# Altium footprint library Molex FFC - FPC Connectors (SMT).PcbLib: 638 footprints (part 30 of 40)
Each footprint in its own frame and in the unit in brackets; x right, y up, seen from the top. Pads: shape width x height; smd on the part's side, far side on the other; paste and mask are expansions set on the pad; w line width, h text height; cw(c..) or ccw(c..) is an arc to the next point about the centre after c.
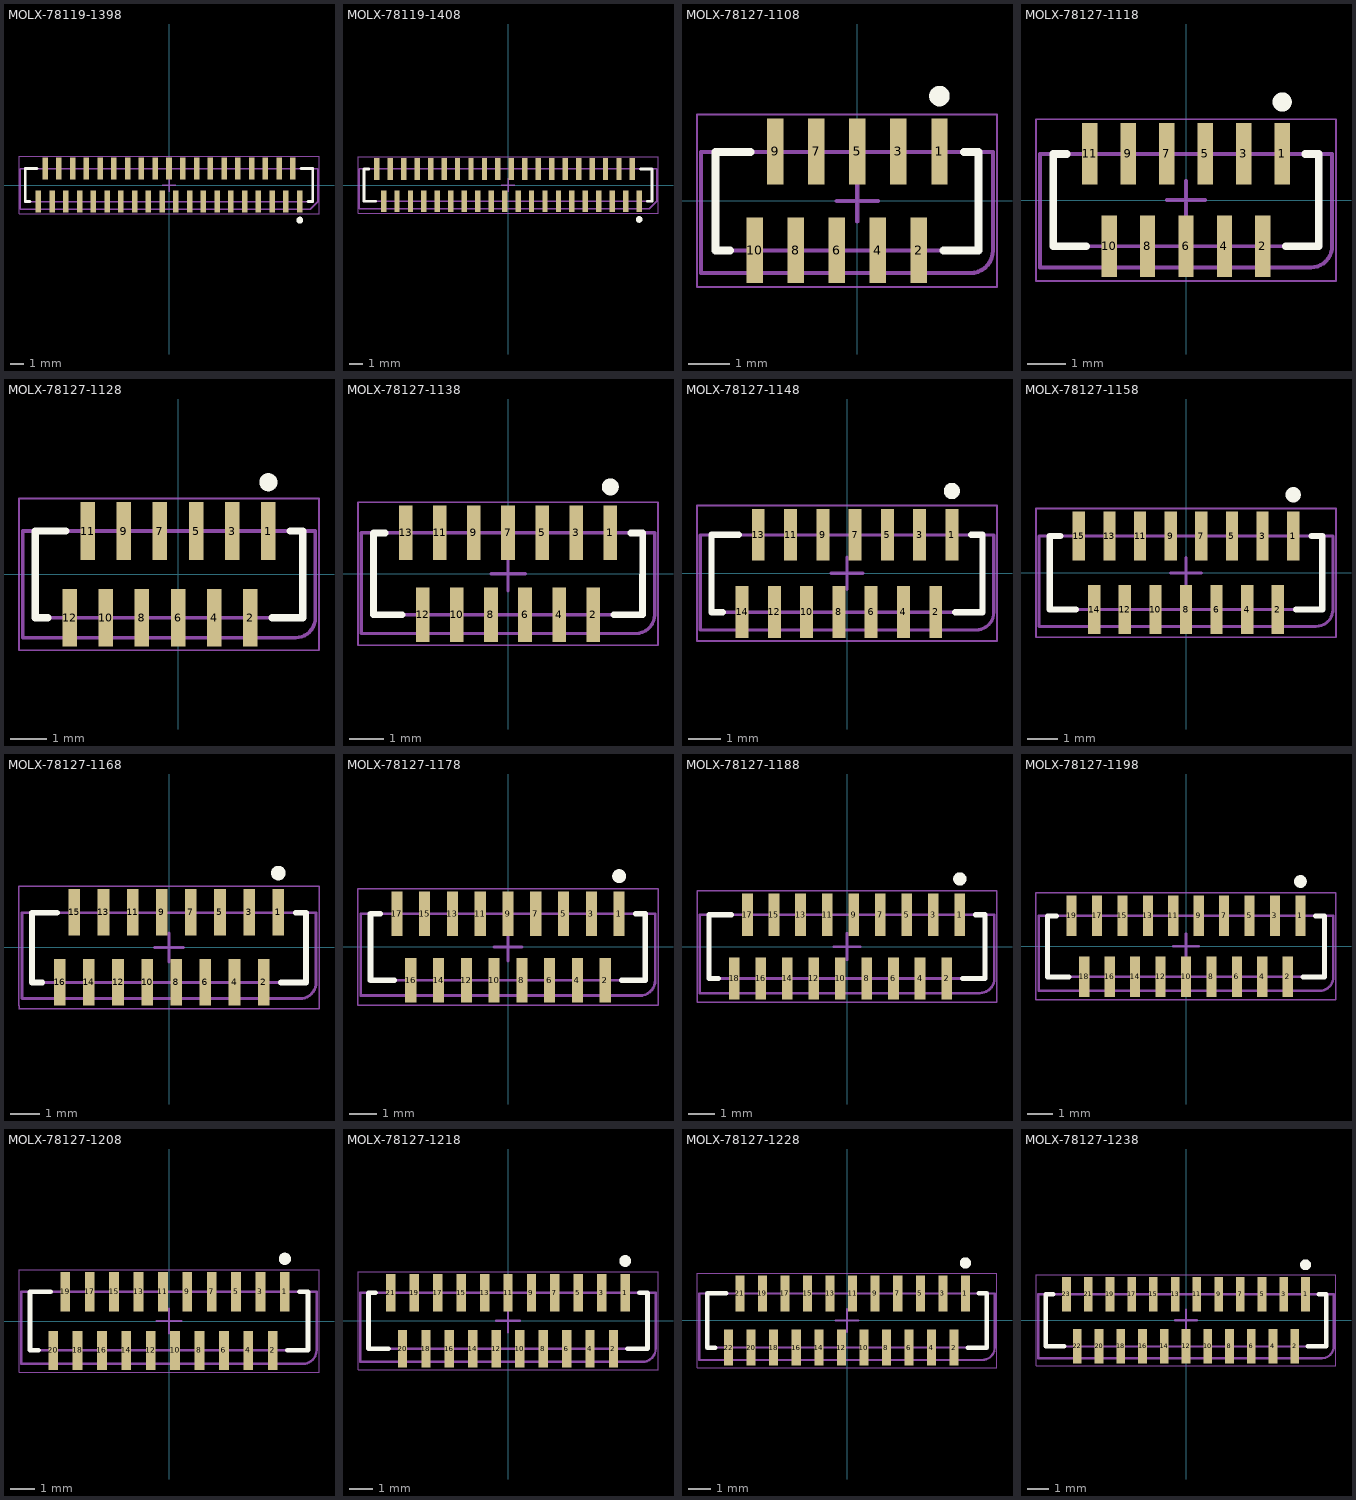
[diagram p29: the footprints below, top view; thin cyan lines are the x and y axes]

## MOLX-78119-1398 [mm] "FPC Connector, 39-Leads, Vertical, Pitch 0.5 mm, Mated Height 4.1 mm, SMT"
height 4.1
pads (39):
  rect 0.4x1.6 smd: 1(9.5,-1.2) 2(9,1.2) 3(8.5,-1.2) 4(8,1.2) 5(7.5,-1.2) 6(7,1.2) 7(6.5,-1.2) 8(6,1.2) 9(5.5,-1.2) 10(5,1.2) 11(4.5,-1.2) 12(4,1.2) 13(3.5,-1.2) 14(3,1.2) 15(2.5,-1.2) 16(2,1.2) 17(1.5,-1.2) 18(1,1.2) 19(0.5,-1.2) 20(0,1.2) 21(-0.5,-1.2) 22(-1,1.2) 23(-1.5,-1.2) 24(-2,1.2) 25(-2.5,-1.2) 26(-3,1.2) 27(-3.5,-1.2) 28(-4,1.2) 29(-4.5,-1.2) 30(-5,1.2) 31(-5.5,-1.2) 32(-6,1.2) 33(-6.5,-1.2) 34(-7,1.2) 35(-7.5,-1.2) 36(-8,1.2) 37(-8.5,-1.2) 38(-9,1.2) 39(-9.5,-1.2)
Top Overlay:
  circle w0.25: c9.5,-2.55 r0.125
  lines w0.2: -10.1,-1.2 -10.45,-1.2 -10.45,1.2 -9.6,1.2 ; 9.6,1.2 10.45,1.2 10.45,-1.2 10.1,-1.2
Mechanical 13:
  lines w0.1: -10.45,1.2 -10.45,-1.2 10.45,-1.2 10.45,1.2 ; -10.45,1.2 10.45,1.2 ; -10.45,1.2 -10.8,1.2 -10.8,-1.75 10.25,-1.75 10.8,-1.2 10.8,1.2 10.45,1.2
Mechanical 15:
  lines w0.05: -10.9,-2.1 10.9,-2.1 10.9,2.1 -10.9,2.1 -10.9,-2.1
  lines w0.1: -0.5,0 0.5,0 ; 0,-0.5 0,0.5
3D body: height 0.25, standoff 0, extent -10.8,-1.75 10.8,1.7

## MOLX-78119-1408 [mm] "FPC Connector, 40-Leads, Vertical, Pitch 0.5 mm, Mated Height 4.1 mm, SMT"
height 4.1
pads (40):
  rect 0.4x1.6 smd: 1(9.75,-1.2) 2(9.25,1.2) 3(8.75,-1.2) 4(8.25,1.2) 5(7.75,-1.2) 6(7.25,1.2) 7(6.75,-1.2) 8(6.25,1.2) 9(5.75,-1.2) 10(5.25,1.2) 11(4.75,-1.2) 12(4.25,1.2) 13(3.75,-1.2) 14(3.25,1.2) 15(2.75,-1.2) 16(2.25,1.2) 17(1.75,-1.2) 18(1.25,1.2) 19(0.75,-1.2) 20(0.25,1.2) 21(-0.25,-1.2) 22(-0.75,1.2) 23(-1.25,-1.2) 24(-1.75,1.2) 25(-2.25,-1.2) 26(-2.75,1.2) 27(-3.25,-1.2) 28(-3.75,1.2) 29(-4.25,-1.2) 30(-4.75,1.2) 31(-5.25,-1.2) 32(-5.75,1.2) 33(-6.25,-1.2) 34(-6.75,1.2) 35(-7.25,-1.2) 36(-7.75,1.2) 37(-8.25,-1.2) 38(-8.75,1.2) 39(-9.25,-1.2) 40(-9.75,1.2)
Top Overlay:
  circle w0.25: c9.75,-2.55 r0.125
  lines w0.2: -10.35,1.2 -10.7,1.2 -10.7,-1.2 -9.85,-1.2 ; 9.85,1.2 10.7,1.2 10.7,-1.2 10.35,-1.2
Mechanical 13:
  lines w0.1: -10.7,1.2 -10.7,-1.2 10.7,-1.2 10.7,1.2 ; -11.05,-1.75 10.5,-1.75 11.05,-1.2 11.05,1.2 -11.05,1.2 -11.05,-1.2 -11.05,-1.75
Mechanical 15:
  lines w0.05: -11.15,-2.1 -11.15,2.1 11.15,2.1 11.15,-2.1 -11.15,-2.1
  lines w0.1: -0.5,0 0.5,0 ; 0,-0.5 0,0.5
3D body: height 0.25, standoff 0, extent -11.05,-1.75 11.05,1.7

## MOLX-78127-1108 [mm] "FPC Connector, 10-Leads, Vertical, Pitch 0.5 mm, Mated Height 4.1 mm, SMT"
height 4.112
pads (10):
  rect 0.4x1.6 smd: 1(2,1.2) 2(1.5,-1.2) 3(1,1.2) 4(0.5,-1.2) 5(0,1.2) 6(-0.5,-1.2) 7(-1,1.2) 8(-1.5,-1.2) 9(-2,1.2) 10(-2.5,-1.2)
Top Overlay:
  circle w0.25: c2,2.55 r0.125
  lines w0.2: -3.1,-1.21 -3.45,-1.21 -3.45,1.19 -2.6,1.19 ; 2.1,-1.21 2.95,-1.21 2.95,1.19 2.6,1.19
Mechanical 13:
  lines w0.1: -3.45,1.19 -3.45,-1.21 2.95,-1.21 2.95,1.19 ; 2.75,-1.759 cw(c2.75,-1.759) 2.75,-1.76 ; 2.75,-1.76 ccw(c2.75,-1.21) 3.3,-1.21 3.3,1.19 -3.8,1.19 -3.8,-1.76 2.75,-1.76
Mechanical 15:
  lines w0.05: -3.9,-2.1 -3.9,2.1 3.4,2.1 3.4,-2.1 -3.9,-2.1
  lines w0.1: -0.5,0 0.5,0 ; 0,-0.5 0,0.5
3D body: height 0.25, standoff 0, extent -3.8,-1.76 3.3,1.69

## MOLX-78127-1118 [mm] "FPC Connector, 11-Leads, Vertical, Pitch 0.5 mm, Mated Height 4.1 mm, SMT"
height 4.112
pads (11):
  rect 0.4x1.6 smd: 1(2.5,1.2) 2(2,-1.2) 3(1.5,1.2) 4(1,-1.2) 5(0.5,1.2) 6(0,-1.2) 7(-0.5,1.2) 8(-1,-1.2) 9(-1.5,1.2) 10(-2,-1.2) 11(-2.5,1.2)
Top Overlay:
  circle w0.25: c2.5,2.55 r0.125
  lines w0.2: -3.1,1.2 -3.45,1.2 -3.45,-1.2 -2.6,-1.2 ; 2.6,-1.2 3.45,-1.2 3.45,1.2 3.1,1.2
Mechanical 13:
  lines w0.1: -3.45,1.2 -3.45,-1.2 3.45,-1.2 3.45,1.2 ; -3.8,-1.75 -3.8,1.2 3.8,1.2 3.8,-1.2 cw(c3.25,-1.2) 3.25,-1.75 -3.8,-1.75
Mechanical 15:
  lines w0.05: -3.9,-2.1 3.9,-2.1 3.9,2.1 -3.9,2.1 -3.9,-2.1
  lines w0.1: -0.5,0 0.5,0 ; 0,-0.5 0,0.5
3D body: height 0.25, standoff 0, extent -3.8,-1.75 3.8,1.7

## MOLX-78127-1128 [mm] "FPC Connector, 12-Leads, Vertical, Pitch 0.5 mm, Mated Height 4.1 mm, SMT"
height 4.112
pads (12):
  rect 0.4x1.6 smd: 1(2.5,1.2) 2(2,-1.2) 3(1.5,1.2) 4(1,-1.2) 5(0.5,1.2) 6(0,-1.2) 7(-0.5,1.2) 8(-1,-1.2) 9(-1.5,1.2) 10(-2,-1.2) 11(-2.5,1.2) 12(-3,-1.2)
Top Overlay:
  circle w0.25: c2.5,2.55 r0.125
  lines w0.2: -3.6,-1.2 -3.95,-1.2 -3.95,1.2 -3.1,1.2 ; 2.6,-1.2 3.45,-1.2 3.45,1.2 3.1,1.2
Mechanical 13:
  lines w0.1: -3.95,1.2 -3.95,-1.2 3.45,-1.2 3.45,1.2 ; -4.3,-1.75 3.25,-1.75 ccw(c3.25,-1.2) 3.8,-1.2 3.8,1.2 -4.3,1.2 -4.3,-1.75
Mechanical 15:
  lines w0.05: -4.4,-2.1 -4.4,2.1 3.9,2.1 3.9,-2.1 -4.4,-2.1
3D body: height 0.25, standoff 0, extent -4.3,-1.75 3.8,1.7

## MOLX-78127-1138 [mm] "FPC Connector, 13-Leads, Vertical, Pitch 0.5 mm, Mated Height 4.1 mm, SMT"
height 4.112
pads (13):
  rect 0.4x1.6 smd: 1(3,1.2) 2(2.5,-1.2) 3(2,1.2) 4(1.5,-1.2) 5(1,1.2) 6(0.5,-1.2) 7(0,1.2) 8(-0.5,-1.2) 9(-1,1.2) 10(-1.5,-1.2) 11(-2,1.2) 12(-2.5,-1.2) 13(-3,1.2)
Top Overlay:
  circle w0.25: c3,2.55 r0.125
  lines w0.2: -3.6,1.2 -3.95,1.2 -3.95,-1.2 -3.1,-1.2 ; 3.1,-1.2 3.95,-1.2 3.95,1.2 3.6,1.2
Mechanical 13:
  lines w0.1: -3.95,1.2 -3.95,-1.2 3.95,-1.2 3.95,1.2 ; -4.3,-1.75 3.75,-1.75 ccw(c3.75,-1.2) 4.3,-1.2 4.3,1.2 -4.3,1.2 -4.3,-1.75
Mechanical 15:
  lines w0.05: -4.4,-2.1 -4.4,2.1 4.4,2.1 4.4,-2.1 -4.4,-2.1
  lines w0.1: -0.5,0 0.5,0 ; 0,-0.5 0,0.5
3D body: height 0.25, standoff 0, extent -4.3,-1.75 4.3,1.7

## MOLX-78127-1148 [mm] "FPC Connector, 14-Leads, Vertical, Pitch 0.5 mm, Mated Height 4.1 mm, SMT"
height 4.112
pads (14):
  rect 0.4x1.6 smd: 1(3.25,1.2) 2(2.75,-1.2) 3(2.25,1.2) 4(1.75,-1.2) 5(1.25,1.2) 6(0.75,-1.2) 7(0.25,1.2) 8(-0.25,-1.2) 9(-0.75,1.2) 10(-1.25,-1.2) 11(-1.75,1.2) 12(-2.25,-1.2) 13(-2.75,1.2) 14(-3.25,-1.2)
Top Overlay:
  circle w0.25: c3.25,2.55 r0.125
  lines w0.2: -3.85,-1.21 -4.2,-1.21 -4.2,1.19 -3.35,1.19 ; 3.35,-1.21 4.2,-1.21 4.2,1.19 3.85,1.19
Mechanical 13:
  lines w0.1: -4.2,1.19 -4.2,-1.21 4.2,-1.21 4.2,1.19 ; -4.55,-1.76 4,-1.76 ccw(c4,-1.21) 4.55,-1.21 4.55,1.19 -4.55,1.19 -4.55,-1.76
Mechanical 15:
  lines w0.05: -4.65,-2.1 4.65,-2.1 4.65,2.1 -4.65,2.1 -4.65,-2.1
  lines w0.1: -0.5,0 0.5,0 ; 0,-0.5 0,0.5
3D body: height 0.25, standoff 0, extent -4.55,-1.76 4.55,1.69

## MOLX-78127-1158 [mm] "FPC Connector, 15-Leads, Vertical, Pitch 0.5 mm, Mated Height 4.1 mm, SMT"
height 4.112
pads (15):
  rect 0.4x1.6 smd: 1(3.5,1.2) 2(3,-1.2) 3(2.5,1.2) 4(2,-1.2) 5(1.5,1.2) 6(1,-1.2) 7(0.5,1.2) 8(0,-1.2) 9(-0.5,1.2) 10(-1,-1.2) 11(-1.5,1.2) 12(-2,-1.2) 13(-2.5,1.2) 14(-3,-1.2) 15(-3.5,1.2)
Top Overlay:
  circle w0.25: c3.5,2.55 r0.125
  lines w0.2: -4.1,1.2 -4.45,1.2 -4.45,-1.2 -3.6,-1.2 ; 3.6,-1.2 4.45,-1.2 4.45,1.2 4.1,1.2
Mechanical 13:
  lines w0.1: -4.45,1.2 -4.45,-1.2 4.45,-1.2 4.45,1.2 ; -4.8,-1.75 -4.8,1.2 4.8,1.2 4.8,-1.2 cw(c4.25,-1.2) 4.25,-1.75 -4.8,-1.75
Mechanical 15:
  lines w0.05: -4.9,-2.1 4.9,-2.1 4.9,2.1 -4.9,2.1 -4.9,-2.1
  lines w0.1: -0.5,0 0.5,0 ; 0,-0.5 0,0.5
3D body: height 0.25, standoff 0, extent -4.8,-1.75 4.8,1.7

## MOLX-78127-1168 [mm] "FPC Connector, 16-Leads, Vertical, Pitch 0.5 mm, Mated Height 4.1 mm, SMT"
height 4.112
pads (16):
  rect 0.4x1.6 smd: 1(3.75,1.2) 2(3.25,-1.2) 3(2.75,1.2) 4(2.25,-1.2) 5(1.75,1.2) 6(1.25,-1.2) 7(0.75,1.2) 8(0.25,-1.2) 9(-0.25,1.2) 10(-0.75,-1.2) 11(-1.25,1.2) 12(-1.75,-1.2) 13(-2.25,1.2) 14(-2.75,-1.2) 15(-3.25,1.2) 16(-3.75,-1.2)
Top Overlay:
  circle w0.25: c3.75,2.55 r0.125
  lines w0.2: -4.35,-1.21 -4.7,-1.21 -4.7,1.19 -3.85,1.19 ; 3.85,-1.21 4.7,-1.21 4.7,1.19 4.35,1.19
Mechanical 13:
  lines w0.1: -4.7,1.19 -4.7,-1.21 4.7,-1.21 4.7,1.19 ; -5.05,-1.76 4.5,-1.76 ccw(c4.5,-1.21) 5.05,-1.21 5.05,1.19 -5.05,1.19 -5.05,-1.76 -5.05,-1.76
Mechanical 15:
  lines w0.05: -5.15,-2.1 5.15,-2.1 5.15,2.1 -5.15,2.1 -5.15,-2 -5.15,-2.1
  lines w0.1: -0.5,0 0.5,0 ; 0,-0.5 0,0.5
3D body: height 0.25, standoff 0, extent -5.05,-1.76 5.05,1.69

## MOLX-78127-1178 [mm] "FPC Connector, 17-Leads, Vertical, Pitch 0.5 mm, Mated Height 4.1 mm, SMT"
height 4.112
pads (17):
  rect 0.4x1.6 smd: 1(4,1.2) 2(3.5,-1.2) 3(3,1.2) 4(2.5,-1.2) 5(2,1.2) 6(1.5,-1.2) 7(1,1.2) 8(0.5,-1.2) 9(0,1.2) 10(-0.5,-1.2) 11(-1,1.2) 12(-1.5,-1.2) 13(-2,1.2) 14(-2.5,-1.2) 15(-3,1.2) 16(-3.5,-1.2) 17(-4,1.2)
Top Overlay:
  circle w0.25: c4,2.55 r0.125
  lines w0.2: -4.6,1.2 -4.95,1.2 -4.95,-1.2 -4.1,-1.2 ; 4.1,-1.197 4.947,-1.197 4.947,1.2 4.6,1.2
Mechanical 13:
  lines w0.1: -4.95,1.2 -4.95,-1.2 4.95,-1.2 4.95,1.196 ; -5.3,-1.75 4.749,-1.75 ccw(c4.75,-1.2) 5.3,-1.2 5.3,1.2 -5.3,1.2 -5.3,-1.75
Mechanical 15:
  lines w0.05: -5.4,-2.1 5.4,-2.1 5.4,2.1 -5.4,2.1 -5.4,-2.1
  lines w0.1: -0.5,0 0.5,0 ; 0,-0.5 0,0.5
3D body: height 0.25, standoff 0, extent -5.3,-1.75 5.3,1.7

## MOLX-78127-1188 [mm] "FPC Connector, 18-Leads, Vertical, Pitch 0.5 mm, Mated Height 4.1 mm, SMT"
height 4.112
pads (18):
  rect 0.4x1.6 smd: 1(4.25,1.2) 2(3.75,-1.2) 3(3.25,1.2) 4(2.75,-1.2) 5(2.25,1.2) 6(1.75,-1.2) 7(1.25,1.2) 8(0.75,-1.2) 9(0.25,1.2) 10(-0.25,-1.2) 11(-0.75,1.2) 12(-1.25,-1.2) 13(-1.75,1.2) 14(-2.25,-1.2) 15(-2.75,1.2) 16(-3.25,-1.2) 17(-3.75,1.2) 18(-4.25,-1.2)
Top Overlay:
  circle w0.25: c4.25,2.55 r0.125
  lines w0.2: -4.85,-1.2 -5.2,-1.2 -5.2,1.2 -4.35,1.2 ; 4.35,-1.2 5.2,-1.2 5.2,1.2 4.85,1.2
Mechanical 13:
  lines w0.1: -5.2,1.2 -5.2,-1.2 5.2,-1.2 5.2,1.2 ; -5.55,-1.75 5,-1.75 ccw(c5,-1.2) 5.55,-1.2 5.55,1.2 -5.55,1.2 -5.55,-1.75
Mechanical 15:
  lines w0.05: -5.65,-2.1 -5.65,2.1 5.65,2.1 5.65,-2.1 -5.65,-2.1
  lines w0.1: -0.5,0 0.5,0 ; 0,-0.5 0,0.5
3D body: height 0.25, standoff 0, extent -5.55,-1.75 5.55,1.7

## MOLX-78127-1198 [mm] "FPC Connector, 19-Leads, Vertical, Pitch 0.5 mm, Mated Height 4.1 mm, SMT"
height 4.112
pads (19):
  rect 0.4x1.6 smd: 1(4.5,1.2) 2(4,-1.2) 3(3.5,1.2) 4(3,-1.2) 5(2.5,1.2) 6(2,-1.2) 7(1.5,1.2) 8(1,-1.2) 9(0.5,1.2) 10(0,-1.2) 11(-0.5,1.2) 12(-1,-1.2) 13(-1.5,1.2) 14(-2,-1.2) 15(-2.5,1.2) 16(-3,-1.2) 17(-3.5,1.2) 18(-4,-1.2) 19(-4.5,1.2)
Top Overlay:
  circle w0.25: c4.5,2.55 r0.125
  lines w0.2: -5.1,1.2 -5.45,1.2 -5.45,-1.2 -4.6,-1.2 ; 4.6,-1.2 5.45,-1.2 5.45,1.2 5.1,1.2
Mechanical 13:
  lines w0.1: -5.45,1.2 -5.45,-1.2 5.45,-1.2 5.45,1.2 ; 5.25,-1.75 -5.8,-1.75 -5.8,1.2 5.8,1.2 5.8,-1.2 cw(c5.25,-1.2) 5.25,-1.75
Mechanical 15:
  lines w0.05: -5.9,-2.1 5.9,-2.1 5.9,2.1 -5.9,2.1 -5.9,-2.1
  lines w0.1: -0.5,0 0.5,0 ; 0,-0.5 0,0.5
3D body: height 0.25, standoff 0, extent -5.8,-1.75 5.8,1.7

## MOLX-78127-1208 [mm] "FPC Connector, 20-Leads, Vertical, Pitch 0.5 mm, Mated Height 4.1 mm, SMT"
height 4.112
pads (20):
  rect 0.4x1.6 smd: 1(4.75,1.2) 2(4.25,-1.2) 3(3.75,1.2) 4(3.25,-1.2) 5(2.75,1.2) 6(2.25,-1.2) 7(1.75,1.2) 8(1.25,-1.2) 9(0.75,1.2) 10(0.25,-1.2) 11(-0.25,1.2) 12(-0.75,-1.2) 13(-1.25,1.2) 14(-1.75,-1.2) 15(-2.25,1.2) 16(-2.75,-1.2) 17(-3.25,1.2) 18(-3.75,-1.2) 19(-4.25,1.2) 20(-4.75,-1.2)
Top Overlay:
  circle w0.25: c4.75,2.55 r0.125
  lines w0.2: -5.35,-1.2 -5.7,-1.2 -5.7,1.2 -4.85,1.2 ; 4.85,-1.2 5.7,-1.2 5.7,1.2 5.35,1.2
Mechanical 13:
  lines w0.1: -5.7,1.2 -5.7,-1.2 5.7,-1.2 5.7,1.2 ; 5.5,-1.75 -6.05,-1.75 -6.05,1.2 6.05,1.2 6.05,-1.2 cw(c5.5,-1.2) 5.5,-1.75
Mechanical 15:
  lines w0.05: -6.15,-2.1 6.15,-2.1 6.15,2.1 -6.15,2.1 -6.15,-2.1
  lines w0.1: -0.5,0 0.5,0 ; 0,-0.5 0,0.5
3D body: height 0.25, standoff 0, extent -6.05,-1.75 6.05,1.7

## MOLX-78127-1218 [mm] "FPC Connector, 21-Leads, Vertical, Pitch 0.5 mm, Mated Height 4.1 mm, SMT"
height 4.112
pads (21):
  rect 0.4x1.6 smd: 1(5,1.2) 2(4.5,-1.2) 3(4,1.2) 4(3.5,-1.2) 5(3,1.2) 6(2.5,-1.2) 7(2,1.2) 8(1.5,-1.2) 9(1,1.2) 10(0.5,-1.2) 11(0,1.2) 12(-0.5,-1.2) 13(-1,1.2) 14(-1.5,-1.2) 15(-2,1.2) 16(-2.5,-1.2) 17(-3,1.2) 18(-3.5,-1.2) 19(-4,1.2) 20(-4.5,-1.2) 21(-5,1.2)
Top Overlay:
  circle w0.25: c5,2.55 r0.125
  lines w0.2: -5.65,1.2 -5.95,1.2 -5.95,-1.2 -5.1,-1.2 ; 5.1,-1.2 5.95,-1.2 5.95,1.2 5.6,1.2
Mechanical 13:
  lines w0.1: -5.95,1.2 -5.95,-1.2 5.95,-1.2 5.95,1.2 ; -6.3,-1.75 -6.3,1.2 6.3,1.2 6.3,-1.2 cw(c5.75,-1.2) 5.75,-1.75 -6.3,-1.75
Mechanical 15:
  lines w0.05: -6.4,-2.1 6.4,-2.1 6.4,2.1 -6.4,2.1 -6.4,-2.1
  lines w0.1: -0.5,0 0.5,0 ; 0,-0.5 0,0.5
3D body: height 0.25, standoff 0, extent -6.3,-1.75 6.3,1.7

## MOLX-78127-1228 [mm] "FPC Connector, 22-Leads, Vertical, Pitch 0.5 mm, Mated Height 4.1 mm, SMT"
height 4.112
pads (22):
  rect 0.4x1.6 smd: 1(5.25,1.2) 2(4.75,-1.2) 3(4.25,1.2) 4(3.75,-1.2) 5(3.25,1.2) 6(2.75,-1.2) 7(2.25,1.2) 8(1.75,-1.2) 9(1.25,1.2) 10(0.75,-1.2) 11(0.25,1.2) 12(-0.25,-1.2) 13(-0.75,1.2) 14(-1.25,-1.2) 15(-1.75,1.2) 16(-2.25,-1.2) 17(-2.75,1.2) 18(-3.25,-1.2) 19(-3.75,1.2) 20(-4.25,-1.2) 21(-4.75,1.2) 22(-5.25,-1.2)
Top Overlay:
  circle w0.25: c5.25,2.55 r0.125
  lines w0.2: -5.85,-1.2 -6.2,-1.2 -6.2,1.2 -5.35,1.2 ; 5.35,-1.2 6.2,-1.2 6.2,1.2 5.85,1.2
Mechanical 13:
  lines w0.1: -6.2,1.2 -6.2,-1.2 6.2,-1.2 6.2,1.2 ; -6.55,-1.75 -6.55,1.2 6.55,1.2 6.55,-1.2 cw(c6,-1.2) 6,-1.75 -6.55,-1.75
Mechanical 15:
  lines w0.05: -6.65,-2.1 6.65,-2.1 6.65,2.1 -6.65,2.1 -6.65,-2.1
  lines w0.1: -0.5,0 0.5,0 ; 0,-0.5 0,0.5
3D body: height 0.25, standoff 0, extent -6.55,-1.75 6.55,1.7

## MOLX-78127-1238 [mm] "FPC Connector, 23-Leads, Vertical, Pitch 0.5 mm, Mated Height 4.1 mm, SMT"
height 4.112
pads (23):
  rect 0.4x1.6 smd: 1(5.5,1.2) 2(5,-1.2) 3(4.5,1.2) 4(4,-1.2) 5(3.5,1.2) 6(3,-1.2) 7(2.5,1.2) 8(2,-1.2) 9(1.5,1.2) 10(1,-1.2) 11(0.5,1.2) 12(0,-1.2) 13(-0.5,1.2) 14(-1,-1.2) 15(-1.5,1.2) 16(-2,-1.2) 17(-2.5,1.2) 18(-3,-1.2) 19(-3.5,1.2) 20(-4,-1.2) 21(-4.5,1.2) 22(-5,-1.2) 23(-5.5,1.2)
Top Overlay:
  circle w0.25: c5.5,2.55 r0.125
  lines w0.2: -6.1,1.2 -6.45,1.2 -6.45,1.199 -6.45,-1.2 ; -5.6,-1.2 -6.45,-1.2 ; 5.6,-1.2 6.45,-1.2 6.45,1.2 6.449,1.2 6.1,1.2 ; -6.45,-1.2 -6.45,-1.2
Mechanical 13:
  lines w0.1: -6.45,1.2 -6.45,-1.2 6.45,-1.2 6.45,1.2 ; -6.8,-1.75 6.25,-1.75 ccw(c6.25,-1.2) 6.8,-1.2 6.8,1.2 -6.8,1.2 -6.8,-1.75
Mechanical 15:
  lines w0.05: -6.9,-2.1 -6.9,2.1 6.9,2.1 6.9,-2.1 -6.9,-2.1
  lines w0.1: -0.5,0 0.5,0 ; 0,-0.5 0,0.5
3D body: height 0.25, standoff 0, extent -6.8,-1.75 6.8,1.7